# Altium integrated library SFMproject.IntLib: 182 symbols
Pins are listed as number, name and electrical type; pins without a type are passive.

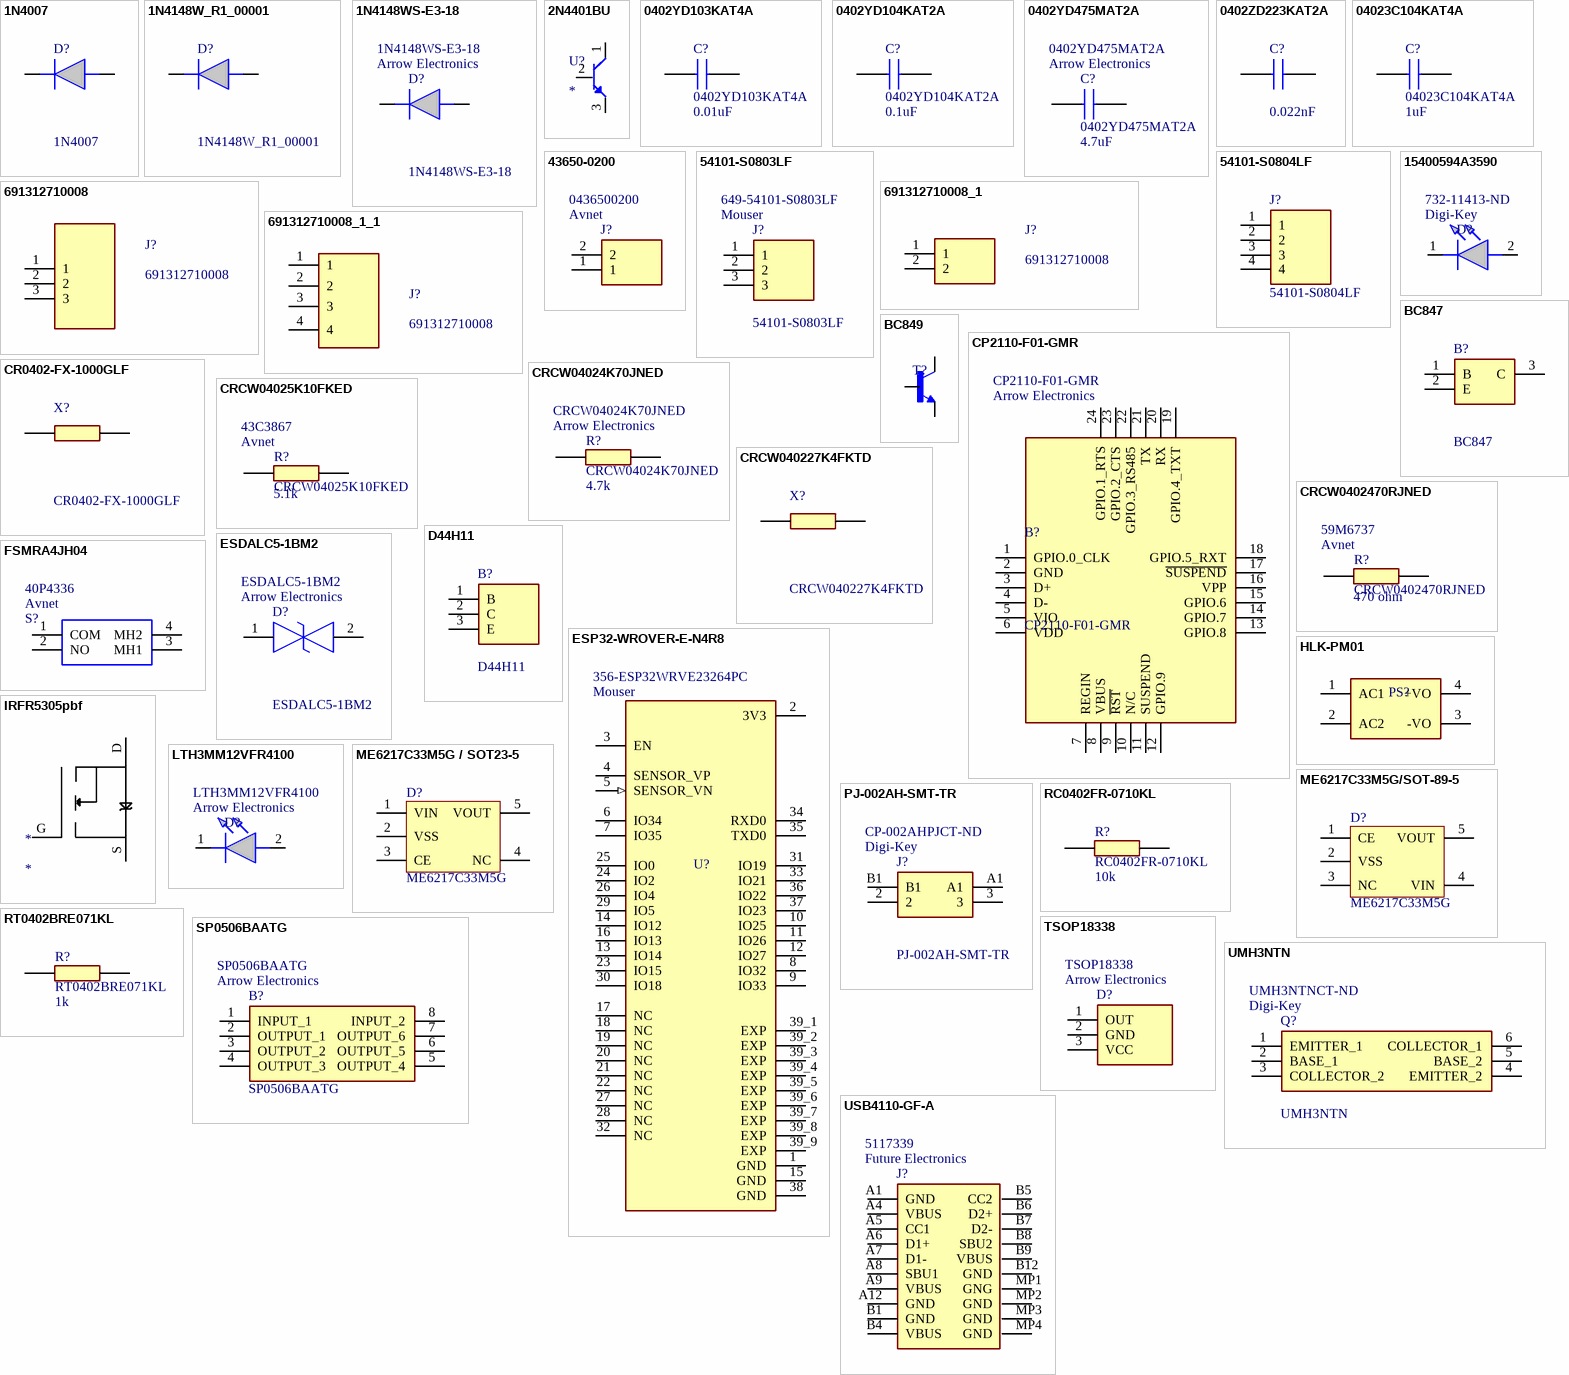
[diagram p0: symbols 1N4007 to USB4110-GF-A]

## 1N4007
designator D?
Switching diode with a peak reverse voltage of 1 kV, a maximum forward current of 1 A, and a peak repetitive forward current of 5.4 A; Manufacturer_Name: Diotec; Mouser Part Number: 637-1N4007; Mouser Price/Stock: https://www.mouser.co.uk/ProductDetail/Diotec-Semiconductor/1N4007?qs=OlC7AqGiEDmK9mU1uTiCkg%3D%3D; Manufacturer_Part_Number: 1N4007; Datasheet Link: https://diotec.com/tl_files/diotec/files/pdf/datasheets/1n4001.pdf
footprint DIOAD1405W58L465D235
pins: 1 K, 2 A

## 1N4148W_R1_00001
designator D?
Diodes - General Purpose, Power, Switching /A2/TR/7"/HF/3K/SOD-123/SWI/SOD/USM-04/USM04-QI01/PJ///; Manufacturer_Name: PANJIT; Geometry.Height: 1.35mm; Mouser Part Number: 241-1N4148W_R1_00001; Mouser Price/Stock: https://www.mouser.co.uk/ProductDetail/Panjit/1N4148W_R1_00001?qs=sPbYRqrBIVnqVztCqPNVrw%3D%3D; Manufacturer_Part_Number: 1N4148W_R1_00001; Datasheet Link: *
footprint SOD3816X135N
pins: 1 K, 2 A

## 1N4148WS-E3-18
designator D?  Supplier 1: Arrow Electronics
VISHAY - 1N4148WS-E3-18 - DIODE, SWITCHING, 150MA, 100V, SOD-323; Geometry.Height: 1.15mm; Mouser Part Number: 78-1N4148WS-E3-18; Mouser Price/Stock: https://www.mouser.co.uk/ProductDetail/Vishay-Semiconductors/1N4148WS-E3-18?qs=bTzheeSci6SMGZleBxLU%2Fg%3D%3D; Manufacturer_Name: Vishay; Manufacturer_Part_Number: 1N4148WS-E3-18; Datasheet Link: https://www.vishay.com/docs/85751/1n4148ws.pdf; Supplier Part Number 1: 1N4148WS-E3-18
footprint SOD2713X115N
pins: 1 K, 2 A

## 2N4401BU
designator U?
Optoisolator Transistor Output 5000Vrms 1 Channel 4-SMD; MF: SHARP/Socle Technology; MP: PC817XNNIP0F; Package: SMD-4 Sharp Microelectronics; Check_prices: https://www.snapeda.com/parts/PC817XNNIP0F/SHARP%252FSocle+Technology/view-part/?ref=eda; SnapEDA_Link: https://www.snapeda.com/parts/PC817XNNIP0F/SHARP%252FSocle+Technology/view-part/?ref=snap; Price: None; Availability: Not in stock; Value: *
footprint TO92127P478H483-3
pins: 1 CT, 2 C, 3 ET

## 0402YD103KAT4A
designator C?  value 0.01uF
Multilayer Ceramic Capacitors MLCC - SMD/SMT 16V 0.01uF X7R 0402 10%; Manufacturer_Name: AVX; Manufacturer_Part_Number: 0402YC103KAT4A; Geometry.Height: 0.56mm; Mouser Part Number: 581-0402YC103KAT4A; Mouser Price/Stock: https://www.mouser.co.uk/ProductDetail/AVX/0402YD104KAT2A?qs=fS3i9m8Z%2FmrV7G1UZb6Y7g%3D%3D; Datasheet Link: *; Supplier Part Number 1: 0402YD104KAT2A; Supplier 1: Avnet
footprint CAPC1005X40N
pins: 1, 2

## 0402YD104KAT2A
designator C?  value 0.1uF
Capacitor MLCC 0402 100nF 16V AVX 0402 Standard 100nF Ceramic Multilayer Capacitor, 16 V dc, +85C, X5R Dielectric, +/-10% SMD; Geometry.Height: 0.56mm; Mouser Part Number: 581-0402YD104K; Mouser Price/Stock: https://www.mouser.co.uk/ProductDetail/AVX/0402YD104KAT2A?qs=fS3i9m8Z%2FmrV7G1UZb6Y7g%3D%3D; Manufacturer_Name: AVX; Manufacturer_Part_Number: 0402YD104KAT2A; Datasheet Link: *; Supplier Part Number 1: 0402YD104KAT2A; Supplier 1: Avnet
footprint CAPC1005X40N
pins: 1, 2

## 0402YD475MAT2A
designator C?  value 4.7uF  Supplier 1: Arrow Electronics
Multilayer Ceramic Capacitors MLCC - SMD/SMT 16V 4.7uF 20% X5R 0402; Manufacturer_Name: AVX; Geometry.Height: 0.71mm; Mouser Part Number: 581-0402YD475MAT2A; Mouser Price/Stock: https://www.mouser.co.uk/ProductDetail/AVX/0402YD475MAT2A?qs=s6nfgz3miVxwCmHE9M6tUg%3D%3D; Manufacturer_Part_Number: 0402YD475MAT2A; Datasheet Link: *; Supplier Part Number 1: 0402YD475MAT2A
footprint CAPC1005X40N
pins: 1, 2

## 0402ZD223KAT2A
designator C?  value 0.022nF  (hidden comment: 0402ZD223KAT2A)
Multilayer Ceramic Capacitors MLCC - SMD/SMT 10V 0.022uF X5R 0402 10%; Manufacturer_Name: AVX; Manufacturer_Part_Number: 0402YD104KAT2A; Geometry.Height: 0.56mm; Mouser Part Number: 581-0402ZD223KAT2A; Mouser Price/Stock: https://www.mouser.co.uk/ProductDetail/AVX/0402YD104KAT2A?qs=fS3i9m8Z%2FmrV7G1UZb6Y7g%3D%3D; Datasheet Link: *; Supplier Part Number 1: 0402YD104KAT2A; Supplier 1: Avnet
footprint CAPC1005X40N
pins: 1, 2

## 04023C104KAT4A
designator C?  value 1uF
Multilayer Ceramic Capacitors MLCC - SMD/SMT 25V .1uF X7R 0402; Manufacturer_Name: AVX; Geometry.Height: 0.56mm; Mouser Part Number: 581-04023C104KAT4A; Mouser Price/Stock: https://www.mouser.co.uk/ProductDetail/AVX/0402YD104KAT2A?qs=fS3i9m8Z%2FmrV7G1UZb6Y7g%3D%3D; Manufacturer_Part_Number: 04023C104KAT4A; Datasheet Link: *; Supplier Part Number 1: 0402YD104KAT2A; Supplier 1: Avnet
footprint CAPC1005X40N
pins: 1, 2

## 43650-0200
designator J?  Supplier 1: Avnet  Supplier Part Number 1: 0436500200  (hidden comment: 43650-0200)
Micro-Fit 3.0 Right-Angle Header, 3.00mm Pitch, Single Row, 2 Circuits, with Snap-in Plastic Peg PCB Lock, Glow-Wire Capable, Black; Manufacturer_Name: Molex; Geometry.Height: 5.57mm; Mouser Part Number: 538-43650-0200; Mouser Price/Stock: https://www.mouser.co.uk/ProductDetail/Molex/43650-0200?qs=HlEFOAM0q6XGaAJJj3Pssw%3D%3D; Manufacturer_Part_Number: 43650-0200; Datasheet Link: https://www.molex.com/pdm_docs/sd/436500200_sd.pdf
footprint 43650-02(00,01,02)
pins: 1, 2

## 54101-S0803LF
designator J?  Supplier 1: Mouser  Supplier Part Number 1: 649-54101-S0803LF
BergStik, Board to Board connector, Unshrouded vertical Header, Through Hole, Single Row, 3 Positions, 2.54 mm Pitch.; Manufacturer_Name: Amphenol Communication Solutions; Geometry.Height: 8.58mm; Mouser Part Number: 649-54101-S0803LF; Mouser Price/Stock: https://www.mouser.co.uk/ProductDetail/Amphenol-FCI/54101-S0803LF?qs=iiM6sTJtPEc921tw16XaKg%3D%3D; Manufacturer_Part_Number: 54101-S0803LF; Datasheet Link: https://cdn.amphenol-cs.com/media/wysiwyg/files/drawing/54101.pdf
footprint 54101S0803LF
pins: 1, 2, 3

## 54101-S0804LF
designator J?
BergStik, Board to Board connector, Unshrouded vertical Header, Through Hole, Single Row, 4 Positions, 2.54 mm Pitch.; Manufacturer_Name: Amphenol Communication Solutions; Geometry.Height: 8.58mm; Mouser Part Number: 649-54101-S0804LF; Mouser Price/Stock: https://www.mouser.co.uk/ProductDetail/Amphenol-FCI/54101-S0803LF?qs=iiM6sTJtPEc921tw16XaKg%3D%3D; Manufacturer_Part_Number: 54101-S0804LF; Datasheet Link: https://cdn.amphenol-cs.com/media/wysiwyg/files/drawing/54101.pdf
footprint 54101S0804LF
pins: 1, 2, 3, 4

## 15400594A3590
designator D?  Supplier 1: Digi-Key  Supplier Part Number 1: 732-11413-ND  (hidden comment: 15400594A3590)
15400594A3590 Wurth Elektronik, WL-TIRW 940nm IR LED, 5 mm Through Hole package; Geometry.Height: 12.1mm; Mouser Part Number: 710-15400594A3590; Mouser Price/Stock: https://www.mouser.co.uk/ProductDetail/Wurth-Elektronik/15400594A3590?qs=5aG0NVq1C4xq5TwbX552tA%3D%3D; Manufacturer_Name: Wurth Elektronik; Manufacturer_Part_Number: 15400594A3590; Datasheet Link: https://www.we-online.com/katalog/datasheet/15400594A3590.pdf
footprint 15400594A3590
pins: 1 K, 2 A

## 691312710008
designator J?
WR-TBL Terminal block - serie 3127; Manufacturer_Name: Wurth Elektronik; Geometry.Height: 8.7mm; Mouser Part Number: 710-691312710008; Mouser Price/Stock: https://www.mouser.com/Search/Refine.aspx?Keyword=710-691312710008; Manufacturer_Part_Number: 691312710008; Datasheet Link: https://componentsearchengine.com/Datasheets/1/691312710008.pdf
footprint SHDRRA8W100P0X500_1X8_4000X1200X870P - duplicate
pins: 1, 2, 3

## 691312710008_1
designator J?, comment 691312710008
WR-TBL Terminal block - serie 3127; Manufacturer_Name: Wurth Elektronik; Geometry.Height: 8.7mm; Mouser Part Number: 710-691312710008; Mouser Price/Stock: https://www.mouser.com/Search/Refine.aspx?Keyword=710-691312710008; Manufacturer_Part_Number: 691312710008; Datasheet Link: https://componentsearchengine.com/Datasheets/1/691312710008.pdf
footprint SHDRRA8W100P0X500_1X8_4000X1200X870P
pins: 1, 2

## 691312710008_1_1
designator J?, comment 691312710008
WR-TBL Terminal block - serie 3127; Manufacturer_Name: Wurth Elektronik; Geometry.Height: 8.7mm; Mouser Part Number: 710-691312710008; Mouser Price/Stock: https://www.mouser.com/Search/Refine.aspx?Keyword=710-691312710008; Manufacturer_Part_Number: 691312710008; Datasheet Link: https://componentsearchengine.com/Datasheets/1/691312710008.pdf
footprint SHDRRA8W100P0X500_1X8_4000X1200X870P - duplicate - duplicate
pins: 1, 2, 3, 4

## BC847
designator B?
Bipolar Transistors - BJT SOT23,NPN,0.1A,45V,G enPur; Manufacturer_Name: Rectron; Geometry.Height: 1.1mm; Mouser Part Number: 583-C847; Mouser Price/Stock: https://www.mouser.co.uk/ProductDetail/Rectron/BC847?qs=7pEAo90IqNG3AIBiPfAQKA%3D%3D; Manufacturer_Part_Number: BC847; Datasheet Link: https://www.arrow.com/en/products/bc847/rectron?region=nac
footprint SOT95P240X110-3N
pins: 1 B, 2 E, 3 C

## BC849
designator T?
Bipolar _BJT_ Transistor NPN 30V 100mA 100MHz 300mW Surface Mount SOT-23-3 _TO-236_; MF: ON Semiconductor; MP: BC849; Value: *; Availability: Unavailable; Price: None; Package: SOT-23 ON Semiconductor; SnapEDA_Link: https://www.snapeda.com/parts/BC849/ON%20Semiconductor/view-part/569416/?ref=snap
footprint SOT23
pins: 1 B, 2 E, 3 C

## CP2110-F01-GMR
designator B?  Supplier 1: Arrow Electronics
SILICON LABS - CP2110-F01-GMR - Interface Bridges, USB to UART, 3 V, 3.6 V, QFN, 24 Pins, -40 C; Geometry.Height: 0.8mm; Mouser Part Number: 634-CP2110-F01-GMR; Mouser Price/Stock: https://www.mouser.co.uk/ProductDetail/Silicon-Labs/CP2110-F01-GMR?qs=1CB38rTTsYoBd%2F8uYjIPcw%3D%3D; Manufacturer_Name: Silicon Labs; Manufacturer_Part_Number: CP2110-F01-GMR; Datasheet Link: https://www.silabs.com/documents/public/data-sheets/CP2110.pdf; Supplier Part Number 1: CP2110-F01-GMR
footprint QFN50P400X400X80-25N-D -2
pins: 1 GPIO.0_CLK, 2 GND, 3 D+, 4 D-, 5 VIO, 6 VDD, 7 REGIN, 8 VBUS, 9 ~{RST}, 10 N/C, 11 SUSPEND, 12 GPIO.9, 13 GPIO.8, 14 GPIO.7, 15 GPIO.6, 16 VPP, 17 ~{SUSPEND}, 18 GPIO.5_RXT, 19 GPIO.4_TXT, 20 RX, 21 TX, 22 GPIO.3_RS485, 23 GPIO.2_CTS, 24 GPIO.1_RTS

## CR0402-FX-1000GLF
designator X?
SMD 0402 thick film resistor 100R 1% Bourns CR0402 Series Thick Film Resistor 0402 Case 100 +/-1% 0.0625W +/-100ppm/C; Geometry.Height: 0.4mm; Mouser Part Number: 652-CR0402FX-1000GLF; Mouser Price/Stock: https://www.mouser.co.uk/ProductDetail/Bourns/CR0402-FX-1000GLF?qs=URDPQ%2Fj0cz04RhAdmECPqw%3D%3D; Manufacturer_Name: Bourns; Manufacturer_Part_Number: CR0402-FX-1000GLF; Datasheet Link: https://www.bourns.com/pdfs/CR0402.pdf
footprint RESC1005X40N
pins: 1, 2

## CRCW04024K70JNED
designator R?  value 4.7k  Supplier 1: Arrow Electronics
VISHAY - CRCW04024K70JNED - RES, THICK FILM, 4K7, 5%, 0.063W, 0402; Geometry.Height: 0.4mm; Mouser Part Number: 71-CRCW0402J-4.7K-E3; Mouser Price/Stock: https://www.mouser.co.uk/ProductDetail/Vishay-Dale/CRCW04024K70JNED?qs=iWCWVRvNViwY%252BotGHUbALg%3D%3D; Manufacturer_Name: Vishay; Manufacturer_Part_Number: CRCW04024K70JNED; Datasheet Link: http://www.vishay.com/docs/20035/dcrcwe3.pdf; Supplier Part Number 1: CRCW04024K70JNED
footprint RESC1005X40N
pins: 1, 2

## CRCW04025K10FKED
designator R?  value 5.1k  Supplier 1: Avnet  Supplier Part Number 1: 43C3867
Thick Film Resistors - SMD 3/4watt 5.1Kohms 5%; Manufacturer_Name: Vishay; Geometry.Height: 0.4mm; Mouser Part Number: 71-CRCW0402-5.1K-E3; Mouser Price/Stock: https://www.mouser.co.uk/ProductDetail/Vishay-Dale/CRCW04024K70JNED?qs=iWCWVRvNViwY%252BotGHUbALg%3D%3D; Manufacturer_Part_Number: CRCW04025K10FKED; Datasheet Link: http://www.vishay.com/docs/20035/dcrcwe3.pdf
footprint RESC1005X40N
pins: 1, 2

## CRCW040227K4FKTD
designator X?
Thick Film Resistors - SMD 1/16watt 27.4Kohms 1%; Manufacturer_Name: Vishay; Geometry.Height: 0.4mm; Mouser Part Number: 71-CRCW0402-27.4K; Mouser Price/Stock: https://www.mouser.co.uk/ProductDetail/Vishay-Dale/CRCW040227K4FKTD?qs=r5im4gEiTnFagxYI2ivMOg%3D%3D; Manufacturer_Part_Number: CRCW040227K4FKTD; Datasheet Link: http://www.vishay.com/docs/20035/dcrcwe3.pdf
footprint RESC1005X40N
pins: 1, 2

## CRCW0402470RJNED
designator R?  value 470 ohm  Supplier 1: Avnet  Supplier Part Number 1: 59M6737
Thick Film Resistors - SMD 1/16watt 470ohms 5%; Manufacturer_Name: Vishay; Geometry.Height: 0.4mm; Mouser Part Number: 71-CRCW0402J-470-E3; Mouser Price/Stock: https://www.mouser.co.uk/ProductDetail/Vishay-Dale/CRCW04024K70JNED?qs=iWCWVRvNViwY%252BotGHUbALg%3D%3D; Manufacturer_Part_Number: CRCW0402470RJNED; Datasheet Link: http://www.vishay.com/docs/20035/dcrcwe3.pdf
footprint RESC1005X40N
pins: 1, 2

## D44H11
designator B?
D44H11, NPN Bipolar Transistor,  20 A 80 V HFE:40 Power, 3-Pin TO-220; Manufacturer_Name: STMicroelectronics; Geometry.Height: 4.6mm; Mouser Part Number: 511-D44H11; Mouser Price/Stock: https://www.mouser.co.uk/ProductDetail/STMicroelectronics/D44H11?qs=ljbEvF4DwOODgMo8k6UOWA%3D%3D; Manufacturer_Part_Number: D44H11; Datasheet Link: http://www.st.com/web/en/resource/technical/document/datasheet/CD00000942.pdf
footprint TO270P460X1020X2008-3P
pins: 1 B, 2 C, 3 E

## ESDALC5-1BM2
designator D?  Supplier 1: Arrow Electronics
Clamp - Ipp Tvs Diode Surface Mount SOD-882, 5V, 150W, -55C~150C; Manufacturer_Name: STMicroelectronics; Geometry.Height: 0.5mm; Mouser Part Number: 511-ESDALC5-1BM2; Mouser Price/Stock: https://www.mouser.co.uk/ProductDetail/STMicroelectronics/ESDALC5-1BM2?qs=z0iXaKah%2FHD83bi3LWB72A%3D%3D; Manufacturer_Part_Number: ESDALC5-1BM2; Datasheet Link: https://www.st.com/resource/en/datasheet/esdalc5-1bm2.pdf; Supplier Part Number 1: ESDALC5-1BM2
footprint ESDALC51BM2
pins: 1, 2

## ESP32-WROVER-E-N4R8
designator U?  Supplier 1: Mouser  Supplier Part Number 1: 356-ESP32WRVE23264PC
Bluetooth, WiFi 802.11b/g/n, Bluetooth v4.2 +EDR Transceiver Module 2.4GHz ~ 2.5GHz PCB Trace Surface Mount; MF: Espressif Systems; MP: ESP32WROVEREN4R8; SnapEDA_Link: https://www.snapeda.com/parts/ESP32WROVEREN4R8/Espressif+Systems/view-part/?ref=snap; Price: None; Check_prices: https://www.snapeda.com/parts/ESP32WROVEREN4R8/Espressif+Systems/view-part/?ref=eda; Value: *; Package: None; Availability: In Stock; Purchase-URL: https://pricing.snapeda.com/search/part/ESP32WROVEREN4R8/?ref=eda
footprint XCVR_ESP32-WROVER-E-N4R8
pins: 1 GND (power), 2 3V3 (power), 3 EN, 4 SENSOR_VP, 5 SENSOR_VN (in), 6 IO34, 7 IO35, 8 IO32, 9 IO33, 10 IO25, 11 IO26, 12 IO27, 13 IO14, 14 IO12, 15 GND (power), 16 IO13, 17 NC, 18 NC, 19 NC, 20 NC, 21 NC, 22 NC, 23 IO15, 24 IO2, 25 IO0, 26 IO4, 27 NC, 28 NC, 29 IO5, 30 IO18, 31 IO19, 32 NC, 33 IO21, 34 RXD0, 35 TXD0, 36 IO22, 37 IO23, 38 GND (power), 39_1 EXP (power), 39_2 EXP (power), 39_3 EXP (power), 39_4 EXP (power), 39_5 EXP (power), 39_6 EXP (power), 39_7 EXP (power), 39_8 EXP (power), 39_9 EXP (power)

## FSMRA4JH04
designator S?  Supplier 1: Avnet  Supplier Part Number 1: 40P4336  (hidden comment: *)
Switch, Pushbutton, Tactile, Single Pole, 50mA, Right Angle; MP: FSMRA4JH04; MF: TE Connectivity; Package: None; Purchase-URL: https://pricing.snapeda.com/search/part/FSMRA4JH04/?ref=eda; Check_prices: https://www.snapeda.com/parts/FSMRA4JH04/TE%20Connectivity/view-part/45679/?ref=eda; Availability: Good; Price: None; SnapEDA_Link: https://www.snapeda.com/parts/FSMRA4JH04/TE%20Connectivity/view-part/45679/?ref=snap; Value: *
footprint FSMRA4JH04
pins: 1 COM, 2 NO, 3 MH1, 4 MH2

## HLK-PM01
designator PS?  (value not drawn)
The HLK-PM01 is a small size low cost AC to DC converter which can take in 110V/220V AC at 50/60 Hz and give 5V 3W output. The module is can be used in designs which run on 5V and needs to be powered form the AC mains.; MF: Hi-link; Package: None; Value: *; Price: None; Check_prices: https://www.snapeda.com/parts/hlk-pm01/Hi-link/view-part/?ref=eda; MP: hlk-pm01; Availability: Not in stock; SnapEDA_Link: https://www.snapeda.com/parts/hlk-pm01/Hi-link/view-part/?ref=snap
footprint CONV_HLK-PM01
pins: 1 AC1, 2 AC2, 3 -VO, 4 +VO

## IRFR5305pbf
designator *
footprint DPAK228P970X238-3N (D-PAK, 3-Pads, Body 6.20x6.72mm (max), IPC Medium Density)
pins: D, G, S

## LTH3MM12VFR4100
designator D?  Supplier 1: Arrow Electronics  (hidden comment: LTH3MM12VFR4100)
Standard LEDs - Through Hole 3mm Thru Hole LED 625nm for 12VDC; Manufacturer_Name: Visual Communications Company; Geometry.Height: 6.3mm; Mouser Part Number: 593-LTH3MM12VFR4100; Mouser Price/Stock: https://www.mouser.co.uk/ProductDetail/VCC/LTH3MM12VFR4100?qs=Mv7BduZupUhznjtoVCBbVQ%3D%3D; Manufacturer_Part_Number: LTH3MM12VFR4100; Datasheet Link: https://vcclite.com/wp-content/uploads/wpallimport/files/files/LTH3MM12VFR4100.pdf; Supplier Part Number 1: LTH3MM12VFR4100
footprint LTH3MM12VFR4100
pins: 1 K, 2 A

## ME6217C33M5G / SOT23-5
designator D?, comment ME6217C33M5G
footprint SOT-23-5_L2.9-W1.6-P0.95-LS2.8-BR
pins: 1 VIN, 2 VSS, 3 CE, 4 NC, 5 VOUT

## ME6217C33M5G/SOT-89-5
designator D?, comment ME6217C33M5G
footprint SOT89-150P410X160-5N (SOT89, 3-Leads, Body 4.50x2.45mm, Pitch 1.50mm, Lead Span 4.1mm, IPC Medium Density)
pins: 1 CE, 2 VSS, 3 NC, 4 VIN, 5 VOUT

## PJ-002AH-SMT-TR
designator J?  Supplier 1: Digi-Key  Supplier Part Number 1: CP-002AHPJCT-ND
DC Power Connectors Power Jacks; Manufacturer_Name: CUI Devices; Geometry.Height: 11.23mm; Mouser Part Number: 490-PJ-002AH-SMT-TR; Mouser Price/Stock: https://www.mouser.co.uk/ProductDetail/CUI-Devices/PJ-002AH-SMT-TR?qs=WyjlAZoYn52i5LSWfoFS9w%3D%3D; Manufacturer_Part_Number: PJ-002AH-SMT-TR; Datasheet Link: https://www.cuidevices.com/product/resource/pj-002ah-smt-tr.pdf
footprint PJ002AHSMTTR
pins: 2, 3, A1, B1

## RC0402FR-0710KL
designator R?  value 10k
Yageo 10k, 0402 (1005M) Thick Film SMD Resistor +/-1% 0.063W - RC0402FR-0710KL; Geometry.Height: 0.4mm; Mouser Part Number: 603-RC0402FR-0710KL; Mouser Price/Stock: https://www.mouser.co.uk/ProductDetail/YAGEO/RC0402FR-0710KL?qs=I1mnnYJTTsxUoNwrUsQExA%3D%3D; Manufacturer_Name: YAGEO; Manufacturer_Part_Number: RC0402FR-0710KL; Datasheet Link: https://componentsearchengine.com/Datasheets/2/RC0402FR-0710KL.pdf; Supplier Part Number 1: 7468275; Supplier 1: Future Electronics
footprint RESC1005X40N
pins: 1, 2

## RT0402BRE071KL
designator R?  value 1k
Thin Film Resistors - SMD 1/16W 1K ohm .1% 50ppm; Manufacturer_Name: YAGEO; Geometry.Height: 0.4mm; Mouser Part Number: 603-RT0402BRE071KL; Mouser Price/Stock: https://www.mouser.co.uk/ProductDetail/YAGEO/RC0402FR-0710KL?qs=I1mnnYJTTsxUoNwrUsQExA%3D%3D; Manufacturer_Part_Number: RT0402BRE071KL; Datasheet Link: https://componentsearchengine.com/Datasheets/2/RC0402FR-0710KL.pdf; Supplier 1: Future Electronics; Supplier Part Number 1: 3025706
footprint RESC1005X40N
pins: 1, 2

## SP0506BAATG
designator B?  Supplier 1: Arrow Electronics
TVS Diode Arrays; Manufacturer_Name: LITTELFUSE; Geometry.Height: 1.17mm; Mouser Part Number: 576-SP0506BAATG; Mouser Price/Stock: https://www.mouser.co.uk/ProductDetail/Littelfuse/SP0506BAATG?qs=RnOBYWd%2Fz7c6KTUitxDieg%3D%3D; Manufacturer_Part_Number: SP0506BAATG; Datasheet Link: https://www.littelfuse.com/~/media/electronics/datasheets/tvs_diode_arrays/littelfuse_tvs_diode_array_sp05_datasheet.pdf.pdf; Supplier Part Number 1: SP0506BAATG
footprint SOP65P488X117-8N
pins: 1 INPUT_1, 2 OUTPUT_1, 3 OUTPUT_2, 4 OUTPUT_3, 5 OUTPUT_4, 6 OUTPUT_5, 7 OUTPUT_6, 8 INPUT_2

## TSOP18338
designator D?  Supplier 1: Arrow Electronics  (hidden comment: TSOP18338)
Infrared Receivers Minicast AGC3 38kHz 2.5-5.5V; Manufacturer_Name: Vishay; Mouser Part Number: 78-TSOP18338; Mouser Price/Stock: https://www.mouser.co.uk/ProductDetail/Vishay-Semiconductors/TSOP1838?qs=xIYnuWu13fNltSDswXyV7w%3D%3D; Manufacturer_Part_Number: TSOP18338; Datasheet Link: *; Supplier Part Number 1: TSOP18338
footprint TSOP4856
pins: 1 OUT, 2 GND, 3 VCC

## UMH3NTN
designator Q?  Supplier 1: Digi-Key  Supplier Part Number 1: UMH3NTNCT-ND
Bipolar Transistors - Pre-Biased DUAL NPN 50V 100MA SOT-363; Manufacturer_Name: ROHM Semiconductor; Geometry.Height: 1mm; Mouser Part Number: 755-UMH3NTN; Mouser Price/Stock: https://www.mouser.co.uk/ProductDetail/ROHM-Semiconductor/UMH3NTN?qs=4kLU8WoGk0st6ahJ6z2bmw%3D%3D; Manufacturer_Part_Number: UMH3NTN; Datasheet Link: https://componentsearchengine.com/Datasheets/2/UMH3NTN.pdf
footprint UMH3NTN
pins: 1 EMITTER_1, 2 BASE_1, 3 COLLECTOR_2, 4 EMITTER_2, 5 BASE_2, 6 COLLECTOR_1

## USB4110-GF-A
designator J?  Supplier 1: Future Electronics  Supplier Part Number 1: 5117339  (hidden comment: USB4110-GF-A)
CONN USB 2.0 TYPE-C R/A SMT; Manufacturer_Name: GCT (GLOBAL CONNECTOR TECHNOLOGY); Geometry.Height: 3.26mm; Mouser Part Number: 640-USB4110-GF-A; Mouser Price/Stock: https://www.mouser.co.uk/ProductDetail/GCT/USB4110-GF-A?qs=KUoIvG%2F9IlYiZvIXQjyJeA%3D%3D; Manufacturer_Part_Number: USB4110-GF-A; Datasheet Link: https://gct.co/files/drawings/usb4110.pdf
footprint USB4110GFA
pins: A1 GND, A4 VBUS, A5 CC1, A6 D1+, A7 D1-, A8 SBU1, A9 VBUS, A12 GND, B1 GND, B4 VBUS, B5 CC2, B6 D2+, B7 D2-, B8 SBU2, B9 VBUS, B12 GND, MP1 GNG, MP2 GND, MP3 GND, MP4 GND

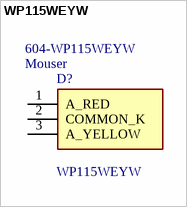
[diagram p1: symbol WP115WEYW]

## WP115WEYW
designator D?  Supplier 1: Mouser  Supplier Part Number 1: 604-WP115WEYW
LED Bi-Color Hi-Eff. Red/Yellow 627nm/590nm 3-Pin T-1 Bulk; Manufacturer_Name: Kingbright; Geometry.Height: 7.1mm; Mouser Part Number: 604-WP115WEYW; Mouser Price/Stock: https://www.mouser.co.uk/ProductDetail/Kingbright/WP115WEYW?qs=58z0TXQGVSR6wNJCc0QydA%3D%3D; Manufacturer_Part_Number: WP115WEYW; Datasheet Link: http://www.kingbrightusa.com/images/catalog/SPEC/WP115WEYW.pdf
footprint WP115WEYW
pins: 1 A_RED, 2 COMMON_K, 3 A_YELLOW


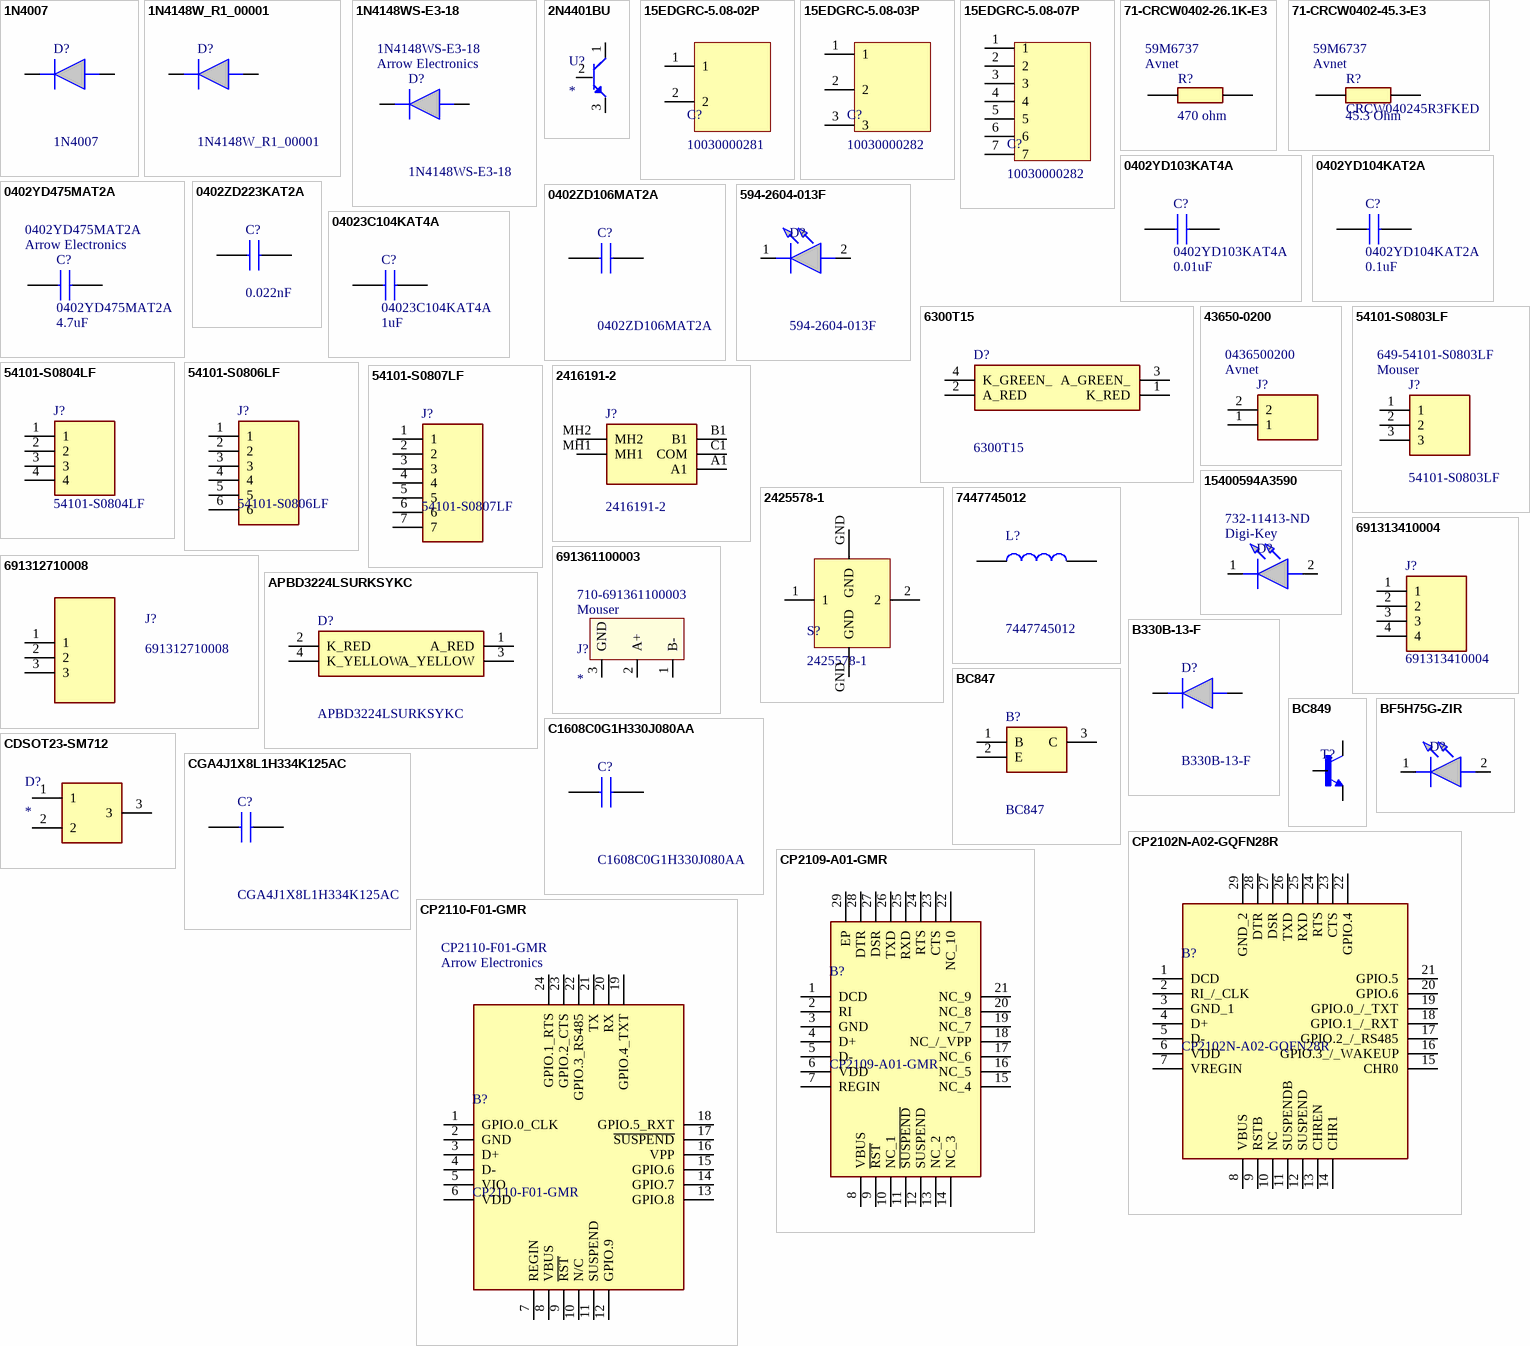
[diagram p2: symbols 1N4007 to CP2110-F01-GMR]

## 1N4007
designator D?
Switching diode with a peak reverse voltage of 1 kV, a maximum forward current of 1 A, and a peak repetitive forward current of 5.4 A; Manufacturer_Name: Diotec; Mouser Part Number: 637-1N4007; Mouser Price/Stock: https://www.mouser.co.uk/ProductDetail/Diotec-Semiconductor/1N4007?qs=OlC7AqGiEDmK9mU1uTiCkg%3D%3D; Manufacturer_Part_Number: 1N4007; Datasheet Link: https://diotec.com/tl_files/diotec/files/pdf/datasheets/1n4001.pdf
footprint DIOAD1405W58L465D235
pins: 1 K, 2 A

## 1N4148W_R1_00001
designator D?
Diodes - General Purpose, Power, Switching /A2/TR/7"/HF/3K/SOD-123/SWI/SOD/USM-04/USM04-QI01/PJ///; Manufacturer_Name: PANJIT; Geometry.Height: 1.35mm; Mouser Part Number: 241-1N4148W_R1_00001; Mouser Price/Stock: https://www.mouser.co.uk/ProductDetail/Panjit/1N4148W_R1_00001?qs=sPbYRqrBIVnqVztCqPNVrw%3D%3D; Manufacturer_Part_Number: 1N4148W_R1_00001; Datasheet Link: *
footprint SOD3816X135N
pins: 1 K, 2 A

## 1N4148WS-E3-18
designator D?  Supplier 1: Arrow Electronics
VISHAY - 1N4148WS-E3-18 - DIODE, SWITCHING, 150MA, 100V, SOD-323; Geometry.Height: 1.15mm; Mouser Part Number: 78-1N4148WS-E3-18; Mouser Price/Stock: https://www.mouser.co.uk/ProductDetail/Vishay-Semiconductors/1N4148WS-E3-18?qs=bTzheeSci6SMGZleBxLU%2Fg%3D%3D; Manufacturer_Name: Vishay; Manufacturer_Part_Number: 1N4148WS-E3-18; Datasheet Link: https://www.vishay.com/docs/85751/1n4148ws.pdf; Supplier Part Number 1: 1N4148WS-E3-18
footprint SOD2713X115N
pins: 1 K, 2 A

## 2N4401BU
designator U?
Optoisolator Transistor Output 5000Vrms 1 Channel 4-SMD; MF: SHARP/Socle Technology; MP: PC817XNNIP0F; Package: SMD-4 Sharp Microelectronics; Check_prices: https://www.snapeda.com/parts/PC817XNNIP0F/SHARP%252FSocle+Technology/view-part/?ref=eda; SnapEDA_Link: https://www.snapeda.com/parts/PC817XNNIP0F/SHARP%252FSocle+Technology/view-part/?ref=snap; Price: None; Availability: Not in stock; Value: *
footprint TO92127P478H483-3
pins: 1 CT, 2 C, 3 ET

## 15EDGRC-5.08-02P
designator C?, comment 10030000281
Pluggable Terminal Blocksnominal current7A.Rated voltage(Ⅱ/2)：450V,pitch:5.08mm,Color:green,Contact surface:Tin
footprint 5EDGRHC-7.62-02P-10020000939
pins: 1, 2

## 15EDGRC-5.08-03P
designator C?, comment 10030000282
Pluggable Terminal Blocksnominal current7A.Rated voltage(Ⅱ/2)：450V,pitch:5.08mm,Color:green,Contact surface:Tin
footprint 15EDGRC-5.08-03P-10030000282
pins: 1, 2, 3

## 15EDGRC-5.08-07P
designator C?, comment 10030000282
Pluggable Terminal Blocksnominal current7A.Rated voltage(Ⅱ/2)：450V,pitch:5.08mm,Color:green,Contact surface:Tin
footprint 5EDGRHC-7.62-07P-10020000939
pins: 1, 2, 3, 4, 5, 6, 7

## 71-CRCW0402-26.1K-E3
designator R?  value 470 ohm  Supplier 1: Avnet  Supplier Part Number 1: 59M6737
Thick Film Resistors - SMD 1/16watt 470ohms 5%; Manufacturer_Name: Vishay; Manufacturer_Part_Number: CRCW0402470RJNED; Geometry.Height: 0.4mm; Mouser Part Number: 71-CRCW0402-26.1K-E3; Mouser Price/Stock: https://www.mouser.co.uk/ProductDetail/Vishay-Dale/CRCW04024K70JNED?qs=iWCWVRvNViwY%252BotGHUbALg%3D%3D; Datasheet Link: http://www.vishay.com/docs/20035/dcrcwe3.pdf
footprint RESC1005X40N
pins: 1, 2

## 71-CRCW0402-45.3-E3
designator R?, comment CRCW040245R3FKED  value 45.3 Ohm  Supplier 1: Avnet  Supplier Part Number 1: 59M6737
Résistances à couches épaisses - CMS 1/16watt 45.3ohms 1%; Manufacturer_Name: Vishay; Geometry.Height: 0.4mm; Mouser Part Number: 71-CRCW0402-45.3-E3; Mouser Price/Stock: https://www.mouser.co.uk/ProductDetail/Vishay-Dale/CRCW04024K70JNED?qs=iWCWVRvNViwY%252BotGHUbALg%3D%3D; Manufacturer_Part_Number: CRCW040245R3FKED; Datasheet Link: http://www.vishay.com/docs/20035/dcrcwe3.pdf
footprint RESC1005X40N
pins: 1, 2

## 0402YD103KAT4A
designator C?  value 0.01uF
Multilayer Ceramic Capacitors MLCC - SMD/SMT 16V 0.01uF X7R 0402 10%; Manufacturer_Name: AVX; Manufacturer_Part_Number: 0402YC103KAT4A; Geometry.Height: 0.56mm; Mouser Part Number: 581-0402YC103KAT4A; Mouser Price/Stock: https://www.mouser.co.uk/ProductDetail/AVX/0402YD104KAT2A?qs=fS3i9m8Z%2FmrV7G1UZb6Y7g%3D%3D; Datasheet Link: *; Supplier Part Number 1: 0402YD104KAT2A; Supplier 1: Avnet
footprint CAPC1005X40N
pins: 1, 2

## 0402YD104KAT2A
designator C?  value 0.1uF
Capacitor MLCC 0402 100nF 16V AVX 0402 Standard 100nF Ceramic Multilayer Capacitor, 16 V dc, +85C, X5R Dielectric, +/-10% SMD; Geometry.Height: 0.56mm; Mouser Part Number: 581-0402YD104K; Mouser Price/Stock: https://www.mouser.co.uk/ProductDetail/AVX/0402YD104KAT2A?qs=fS3i9m8Z%2FmrV7G1UZb6Y7g%3D%3D; Manufacturer_Name: AVX; Manufacturer_Part_Number: 0402YD104KAT2A; Datasheet Link: *; Supplier Part Number 1: 0402YD104KAT2A; Supplier 1: Avnet
footprint CAPC1005X40N
pins: 1, 2

## 0402YD475MAT2A
designator C?  value 4.7uF  Supplier 1: Arrow Electronics
Multilayer Ceramic Capacitors MLCC - SMD/SMT 16V 4.7uF 20% X5R 0402; Manufacturer_Name: AVX; Geometry.Height: 0.71mm; Mouser Part Number: 581-0402YD475MAT2A; Mouser Price/Stock: https://www.mouser.co.uk/ProductDetail/AVX/0402YD475MAT2A?qs=s6nfgz3miVxwCmHE9M6tUg%3D%3D; Manufacturer_Part_Number: 0402YD475MAT2A; Datasheet Link: *; Supplier Part Number 1: 0402YD475MAT2A
footprint CAPC1005X40N
pins: 1, 2

## 0402ZD106MAT2A
designator C?
Multilayer Ceramic Capacitors MLCC - SMD/SMT 10V 10uF X5R 0402 20% Tol; Manufacturer_Name: AVX; Geometry.Height: 0.56mm; Mouser Part Number: 581-0402ZD106MAT2A; Mouser Price/Stock: https://www.mouser.co.uk/ProductDetail/AVX/0402ZD106MAT2A?qs=sJ5gq5MLFXpDfmjiItAxIg%3D%3D; Manufacturer_Part_Number: 0402ZD106MAT2A; Datasheet Link: *
footprint CAPC1005X56N
pins: 1, 2

## 0402ZD223KAT2A
designator C?  value 0.022nF  (hidden comment: 0402ZD223KAT2A)
Multilayer Ceramic Capacitors MLCC - SMD/SMT 10V 0.022uF X5R 0402 10%; Manufacturer_Name: AVX; Manufacturer_Part_Number: 0402YD104KAT2A; Geometry.Height: 0.56mm; Mouser Part Number: 581-0402ZD223KAT2A; Mouser Price/Stock: https://www.mouser.co.uk/ProductDetail/AVX/0402YD104KAT2A?qs=fS3i9m8Z%2FmrV7G1UZb6Y7g%3D%3D; Datasheet Link: *; Supplier Part Number 1: 0402YD104KAT2A; Supplier 1: Avnet
footprint CAPC1005X40N
pins: 1, 2

## 594-2604-013F
designator D?
LED Circuit Board Indicators 1.6mm IceBlue 2mA 13in reel; Manufacturer_Name: Dialight; Geometry.Height: 4.49mm; Mouser Part Number: 645-594-2604-013F; Mouser Price/Stock: https://www.mouser.co.uk/ProductDetail/Dialight/594-2604-013F?qs=GBLSl2AkiruyIh94PfnoyA%3D%3D; Manufacturer_Part_Number: 594-2604-013F; Datasheet Link: https://www.mouser.cn/datasheet/2/109/C18409B-1729493.pdf
footprint 5942604013F
pins: 1 K, 2 A

## 04023C104KAT4A
designator C?  value 1uF
Multilayer Ceramic Capacitors MLCC - SMD/SMT 25V .1uF X7R 0402; Manufacturer_Name: AVX; Geometry.Height: 0.56mm; Mouser Part Number: 581-04023C104KAT4A; Mouser Price/Stock: https://www.mouser.co.uk/ProductDetail/AVX/0402YD104KAT2A?qs=fS3i9m8Z%2FmrV7G1UZb6Y7g%3D%3D; Manufacturer_Part_Number: 04023C104KAT4A; Datasheet Link: *; Supplier Part Number 1: 0402YD104KAT2A; Supplier 1: Avnet
footprint CAPC1005X40N
pins: 1, 2

## 6300T15
designator D?
CBI SMT 1POS R. Angle 2/2.2V Red/GRN TR; Manufacturer_Name: Visual Communications Company; Geometry.Height: 5.28mm; Mouser Part Number: 593-6300T15; Mouser Price/Stock: https://www.mouser.co.uk/ProductDetail/VCC/6300T15?qs=wwacUt%252BV97uGg8E%2FzmrxJA%3D%3D; Manufacturer_Part_Number: 6300T15; Datasheet Link: https://componentsearchengine.com/Datasheets/1/6300T15.pdf
footprint 6300T15
pins: 1 K_RED, 2 A_RED, 3 A_GREEN_, 4 K_GREEN_

## 43650-0200
designator J?  Supplier 1: Avnet  Supplier Part Number 1: 0436500200  (hidden comment: 43650-0200)
Micro-Fit 3.0 Right-Angle Header, 3.00mm Pitch, Single Row, 2 Circuits, with Snap-in Plastic Peg PCB Lock, Glow-Wire Capable, Black; Manufacturer_Name: Molex; Geometry.Height: 5.57mm; Mouser Part Number: 538-43650-0200; Mouser Price/Stock: https://www.mouser.co.uk/ProductDetail/Molex/43650-0200?qs=HlEFOAM0q6XGaAJJj3Pssw%3D%3D; Manufacturer_Part_Number: 43650-0200; Datasheet Link: https://www.molex.com/pdm_docs/sd/436500200_sd.pdf
footprint 43650-02(00,01,02)
pins: 1, 2

## 54101-S0803LF
designator J?  Supplier 1: Mouser  Supplier Part Number 1: 649-54101-S0803LF
BergStik, Board to Board connector, Unshrouded vertical Header, Through Hole, Single Row, 3 Positions, 2.54 mm Pitch.; Manufacturer_Name: Amphenol Communication Solutions; Geometry.Height: 8.58mm; Mouser Part Number: 649-54101-S0803LF; Mouser Price/Stock: https://www.mouser.co.uk/ProductDetail/Amphenol-FCI/54101-S0803LF?qs=iiM6sTJtPEc921tw16XaKg%3D%3D; Manufacturer_Part_Number: 54101-S0803LF; Datasheet Link: https://cdn.amphenol-cs.com/media/wysiwyg/files/drawing/54101.pdf
footprint 54101S0803LF
pins: 1, 2, 3

## 54101-S0804LF
designator J?
BergStik, Board to Board connector, Unshrouded vertical Header, Through Hole, Single Row, 4 Positions, 2.54 mm Pitch.; Manufacturer_Name: Amphenol Communication Solutions; Geometry.Height: 8.58mm; Mouser Part Number: 649-54101-S0804LF; Mouser Price/Stock: https://www.mouser.co.uk/ProductDetail/Amphenol-FCI/54101-S0803LF?qs=iiM6sTJtPEc921tw16XaKg%3D%3D; Manufacturer_Part_Number: 54101-S0804LF; Datasheet Link: https://cdn.amphenol-cs.com/media/wysiwyg/files/drawing/54101.pdf
footprint 54101S0804LF
pins: 1, 2, 3, 4

## 54101-S0806LF
designator J?
BergStik, Board to Board connector, Unshrouded vertical Header, Through Hole, Single Row, 6 Positions, 2.54 mm Pitch.; Manufacturer_Name: Amphenol Communication Solutions; Geometry.Height: 8.58mm; Mouser Part Number: 649-54101-S0806LF; Mouser Price/Stock: https://www.mouser.co.uk/ProductDetail/Amphenol-FCI/54101-S0803LF?qs=iiM6sTJtPEc921tw16XaKg%3D%3D; Manufacturer_Part_Number: 54101-S0806LF; Datasheet Link: https://cdn.amphenol-cs.com/media/wysiwyg/files/drawing/54101.pdf
footprint 54101S0806LF
pins: 1, 2, 3, 4, 5, 6

## 54101-S0807LF
designator J?
BergStik, Board to Board connector, Unshrouded vertical Header, Through Hole, Single Row, 6 Positions, 2.54 mm Pitch.; Manufacturer_Name: Amphenol Communication Solutions; Geometry.Height: 8.58mm; Mouser Part Number: 649-54101-S0807LF; Mouser Price/Stock: https://www.mouser.co.uk/ProductDetail/Amphenol-FCI/54101-S0803LF?qs=iiM6sTJtPEc921tw16XaKg%3D%3D; Manufacturer_Part_Number: 54101-S0807LF; Datasheet Link: https://cdn.amphenol-cs.com/media/wysiwyg/files/drawing/54101.pdf
footprint 54101S0807LF
pins: 1, 2, 3, 4, 5, 6, 7

## 2416191-2
designator J?
Tactile Switches, Screwdriver Slot Actuator Style, NC, Nickel Silver, Low Profile, Support Bracket, 1 mA; Manufacturer_Name: TE Connectivity; Geometry.Height: 7.5mm; Mouser Part Number: 655-2416191-2; Mouser Price/Stock: https://www.mouser.co.uk/ProductDetail/TE-Connectivity-Alcoswitch/2416191-2?qs=amGC7iS6iy%252BYbycUybOuGA%3D%3D; Manufacturer_Part_Number: 2416191-2; Datasheet Link: https://www.te.com/commerce/DocumentDelivery/DDEController?Action=showdoc&DocId=Customer+Drawing%7F2416191%7FA1%7Fpdf%7FEnglish%7FENG_CD_2416191_A1.pdf%7F2416191-1
footprint 24161912
pins: A1, B1, C1 COM, MH1, MH2

## 2425578-1
designator S?
Interrupteurs de contact Edge mount, right angle tactile, 160gf
footprint 2425578-1
pins: 1, 2, GND, GND

## 15400594A3590
designator D?  Supplier 1: Digi-Key  Supplier Part Number 1: 732-11413-ND  (hidden comment: 15400594A3590)
15400594A3590 Wurth Elektronik, WL-TIRW 940nm IR LED, 5 mm Through Hole package; Geometry.Height: 12.1mm; Mouser Part Number: 710-15400594A3590; Mouser Price/Stock: https://www.mouser.co.uk/ProductDetail/Wurth-Elektronik/15400594A3590?qs=5aG0NVq1C4xq5TwbX552tA%3D%3D; Manufacturer_Name: Wurth Elektronik; Manufacturer_Part_Number: 15400594A3590; Datasheet Link: https://www.we-online.com/katalog/datasheet/15400594A3590.pdf
footprint 15400594A3590
pins: 1 K, 2 A

## 7447745012
designator L?
Wurth WE-PD2 Series Wire-wound SMD Inductor with a Ferrite Core, 1.2 uH +/-20% 4.8A Idc; Manufacturer_Name: Wurth Elektronik; Geometry.Height: 2.3mm; Mouser Part Number: 710-7447745012; Mouser Price/Stock: https://www.mouser.co.uk/ProductDetail/Wurth-Elektronik/7447745012?qs=rS3zZhy2AQPlqE5e5q68Rg%3D%3D; Manufacturer_Part_Number: 7447745012; Datasheet Link: *
footprint 7447745012
pins: 1, 2

## 691312710008
designator J?
WR-TBL Terminal block - serie 3127; Manufacturer_Name: Wurth Elektronik; Geometry.Height: 8.7mm; Mouser Part Number: 710-691312710008; Mouser Price/Stock: https://www.mouser.com/Search/Refine.aspx?Keyword=710-691312710008; Manufacturer_Part_Number: 691312710008; Datasheet Link: https://componentsearchengine.com/Datasheets/1/691312710008.pdf
footprint SHDRRA8W100P0X500_1X8_4000X1200X870P - duplicate
pins: 1, 2, 3

## 691313410004
designator J?
WR-TBL Terminal block - serie 3134; Manufacturer_Name: Wurth Elektronik; Geometry.Height: 8.7mm; Mouser Part Number: 710-691313410004; Mouser Price/Stock: https://www.mouser.co.uk/ProductDetail/Wurth-Elektronik/691313410004?qs=E2PpAYvlWVthY%252BgqnT90lw%3D%3D; Manufacturer_Part_Number: 691313410004; Datasheet Link: *
footprint 691313410004
pins: 1, 2, 3, 4

## 691361100003
designator J?  Supplier 1: Mouser  Supplier Part Number 1: 710-691361100003
Borniers enfichable WR-TBL 300VAC 10.5Am Vertical 26-16AWG
footprint PCBComponent_1
pins: 1 B-, 2 A+, 3 GND

## APBD3224LSURKSYKC
designator D?
Standard LEDs - SMD 3.2x2.4MM LOW CU RED /YELLOW SMD; Manufacturer_Name: Kingbright; Geometry.Height: 2.5mm; Mouser Part Number: 604-APBD3224LSURKSYK; Mouser Price/Stock: https://www.mouser.co.uk/ProductDetail/Kingbright/APBD3224LSURKSYKC?qs=ZqXcJfGlKsgeLn9OM1gXfQ%3D%3D; Manufacturer_Part_Number: APBD3224LSURKSYKC; Datasheet Link: http://www.kingbrightusa.com/images/catalog/SPEC/APBD3224LSURKSYKC.pdf
footprint APBD3224LSURKSYKC
pins: 1 A_RED, 2 K_RED, 3 A_YELLOW, 4 K_YELLOW

## B330B-13-F
designator D?
Diodes Inc B330B-13-F, SMT Schottky Diode, 30V 3A, 2-Pin DO-214AA; Manufacturer_Name: Diodes Inc.; Geometry.Height: 2.5mm; Mouser Part Number: 621-B330B-F; Mouser Price/Stock: https://www.mouser.co.uk/ProductDetail/Diodes-Incorporated/B330B-13-F?qs=cOsaT%252BRvuElEdEmWP6m3Zg%3D%3D; Manufacturer_Part_Number: B330B-13-F; Datasheet Link: https://www.diodes.com/assets/Datasheets/ds30924.pdf
footprint DIOM5336X250N
pins: 1 K, 2 A

## BC847
designator B?
Bipolar Transistors - BJT SOT23,NPN,0.1A,45V,G enPur; Manufacturer_Name: Rectron; Geometry.Height: 1.1mm; Mouser Part Number: 583-C847; Mouser Price/Stock: https://www.mouser.co.uk/ProductDetail/Rectron/BC847?qs=7pEAo90IqNG3AIBiPfAQKA%3D%3D; Manufacturer_Part_Number: BC847; Datasheet Link: https://www.arrow.com/en/products/bc847/rectron?region=nac
footprint SOT95P240X110-3N
pins: 1 B, 2 E, 3 C

## BC849
designator T?
Bipolar _BJT_ Transistor NPN 30V 100mA 100MHz 300mW Surface Mount SOT-23-3 _TO-236_; MF: ON Semiconductor; MP: BC849; Value: *; Availability: Unavailable; Price: None; Package: SOT-23 ON Semiconductor; SnapEDA_Link: https://www.snapeda.com/parts/BC849/ON%20Semiconductor/view-part/569416/?ref=snap
footprint SOT23
pins: 1 B, 2 E, 3 C

## BF5H75G-ZIR
designator D?  (value not drawn)
Infrared (IR) Emitter 940nm 1.4V 100mA 40mW/sr @ 100mA 75°; Manufacturer_Part_Number: 3010-BF5H75G-ZIR-ND; Geometry.Height: 12.1mm; Mouser Part Number: 3010-BF5H75G-ZIR-ND
footprint 15400594A3590
pins: 1 K, 2 A

## C1608C0G1H330J080AA
designator C?
TDK C1608 C 33pF Ceramic Multilayer Capacitor, 50 V dc, +125C, C0G Dielectric, +/-5% SMD; Geometry.Height: 0.8mm; Mouser Part Number: 810-C1608C0G1H330J; Mouser Price/Stock: https://www.mouser.co.uk/ProductDetail/TDK/C1608C0G1H330J080AA?qs=NRhsANhppD%2F70C3YqkUsXw%3D%3D; Manufacturer_Name: TDK; Manufacturer_Part_Number: C1608C0G1H330J080AA; Datasheet Link: https://product.tdk.com/info/en/catalog/datasheets/mlcc_commercial_midvoltage_en.pdf
footprint CAPC1608X80N
pins: 1, 2

## CDSOT23-SM712
designator D?
Diode; Manufacturer_Name: Bourns; Manufacturer_Part_Number: CDSOT23-SM712; Datasheet Link: http://uk.rs-online.com/web/p/products/7673728; Height: 1.17mm; Mouser Part Number: 652-CDSOT23-SM712; Mouser Price/Stock: https://www.mouser.co.uk/ProductDetail/Bourns/CDSOT23-SM712?qs=FuI%252BOVLl4%2FLTY%2FGQ265RLA%3D%3D; Arrow Part Number: CDSOT23-SM712; Arrow Price/Stock: https://www.arrow.com/en/products/cdsot23-sm712/bourns?region=europe
footprint SOT95P237X112-3N
pins: 1, 2, 3

## CGA4J1X8L1H334K125AC
designator C?
Multilayer Ceramic Chip Capacitors, Capacitance=0.33uF, LxWxT:2x1.25x1.25mm; Manufacturer_Name: TDK; Geometry.Height: 1.45mm; Mouser Part Number: 810-CGA4J1X8L1H334K1; Mouser Price/Stock: https://www.mouser.co.uk/ProductDetail/TDK/CGA4J1X8L1H334K125AC?qs=W%2FMpXkg%252BdQ7wXGeZmfNwXQ%3D%3D; Manufacturer_Part_Number: CGA4J1X8L1H334K125AC; Datasheet Link: *
footprint CAPC2012X145N
pins: 1, 2

## CP2102N-A02-GQFN28R
designator B?
USB Interface IC USB to UART bridge - QFN28; Manufacturer_Name: Silicon Labs; Geometry.Height: 0.8mm; Manufacturer_Part_Number: CP2102N-A02-GQFN28R; Mouser Part Number: 634-CP2102NA02QFN28R; Mouser Price/Stock: https://www.mouser.co.uk/ProductDetail/Silicon-Labs/CP2102N-A02-GQFN28R?qs=u16ybLDytRag4qKvSH3fTw%3D%3D; Arrow Part Number: CP2102N-A02-GQFN28R; Arrow Price/Stock: https://www.arrow.com/en/products/cp2102n-a02-gqfn28r/silicon-labs?region=nac; Datasheet Link: https://www.silabs.com/documents/public/data-sheets/cp2102n-datasheet.pdf
footprint QFN50P500X500X80-29N-D
pins: 1 DCD, 2 RI_/_CLK, 3 GND_1, 4 D+, 5 D-, 6 VDD, 7 VREGIN, 8 VBUS, 9 RSTB, 10 NC, 11 SUSPENDB, 12 SUSPEND, 13 CHREN, 14 CHR1, 15 CHR0, 16 GPIO.3_/_WAKEUP, 17 GPIO.2_/_RS485, 18 GPIO.1_/_RXT, 19 GPIO.0_/_TXT, 20 GPIO.6, 21 GPIO.5, 22 GPIO.4, 23 CTS, 24 RTS, 25 RXD, 26 TXD, 27 DSR, 28 DTR, 29 GND_2

## CP2109-A01-GMR
designator B?
I/O Controller Interface IC USB to UART Bridge QFN28; Manufacturer_Name: Silicon Labs; Geometry.Height: 1mm; Mouser Part Number: 634-CP2109-A01-GMR; Mouser Price/Stock: https://www.mouser.co.uk/ProductDetail/Silicon-Labs/CP2109-A01-GMR/?qs=Yyy8avaXlIsQmYePmSolcw%3D%3D; Manufacturer_Part_Number: CP2109-A01-GMR; Datasheet Link: https://www.silabs.com/documents/public/data-sheets/CP2102-9.pdf
pins: 1 DCD, 2 RI, 3 GND, 4 D+, 5 D-, 6 VDD, 7 REGIN, 8 VBUS, 9 ~{RST}, 10 NC_1, 11 ~{SUSPEND}, 12 SUSPEND, 13 NC_2, 14 NC_3, 15 NC_4, 16 NC_5, 17 NC_6, 18 NC_/_VPP, 19 NC_7, 20 NC_8, 21 NC_9, 22 NC_10, 23 CTS, 24 RTS, 25 RXD, 26 TXD, 27 DSR, 28 DTR, 29 EP

## CP2110-F01-GMR
designator B?  Supplier 1: Arrow Electronics
SILICON LABS - CP2110-F01-GMR - Interface Bridges, USB to UART, 3 V, 3.6 V, QFN, 24 Pins, -40 C; Geometry.Height: 0.8mm; Mouser Part Number: 634-CP2110-F01-GMR; Mouser Price/Stock: https://www.mouser.co.uk/ProductDetail/Silicon-Labs/CP2110-F01-GMR?qs=1CB38rTTsYoBd%2F8uYjIPcw%3D%3D; Manufacturer_Name: Silicon Labs; Manufacturer_Part_Number: CP2110-F01-GMR; Datasheet Link: https://www.silabs.com/documents/public/data-sheets/CP2110.pdf; Supplier Part Number 1: CP2110-F01-GMR
footprint QFN50P400X400X80-25N-D -2
pins: 1 GPIO.0_CLK, 2 GND, 3 D+, 4 D-, 5 VIO, 6 VDD, 7 REGIN, 8 VBUS, 9 ~{RST}, 10 N/C, 11 SUSPEND, 12 GPIO.9, 13 GPIO.8, 14 GPIO.7, 15 GPIO.6, 16 VPP, 17 ~{SUSPEND}, 18 GPIO.5_RXT, 19 GPIO.4_TXT, 20 RX, 21 TX, 22 GPIO.3_RS485, 23 GPIO.2_CTS, 24 GPIO.1_RTS
